# Altium footprint library Rez-Axial Pot.PcbLib: 113 footprints (part 1 of 8)
Each footprint in its own frame and in the unit in brackets; x right, y up, seen from the top. Pads: shape width x height; smd on the part's side, far side on the other; paste and mask are expansions set on the pad; w line width, h text height; cw(c..) or ccw(c..) is an arc to the next point about the centre after c.
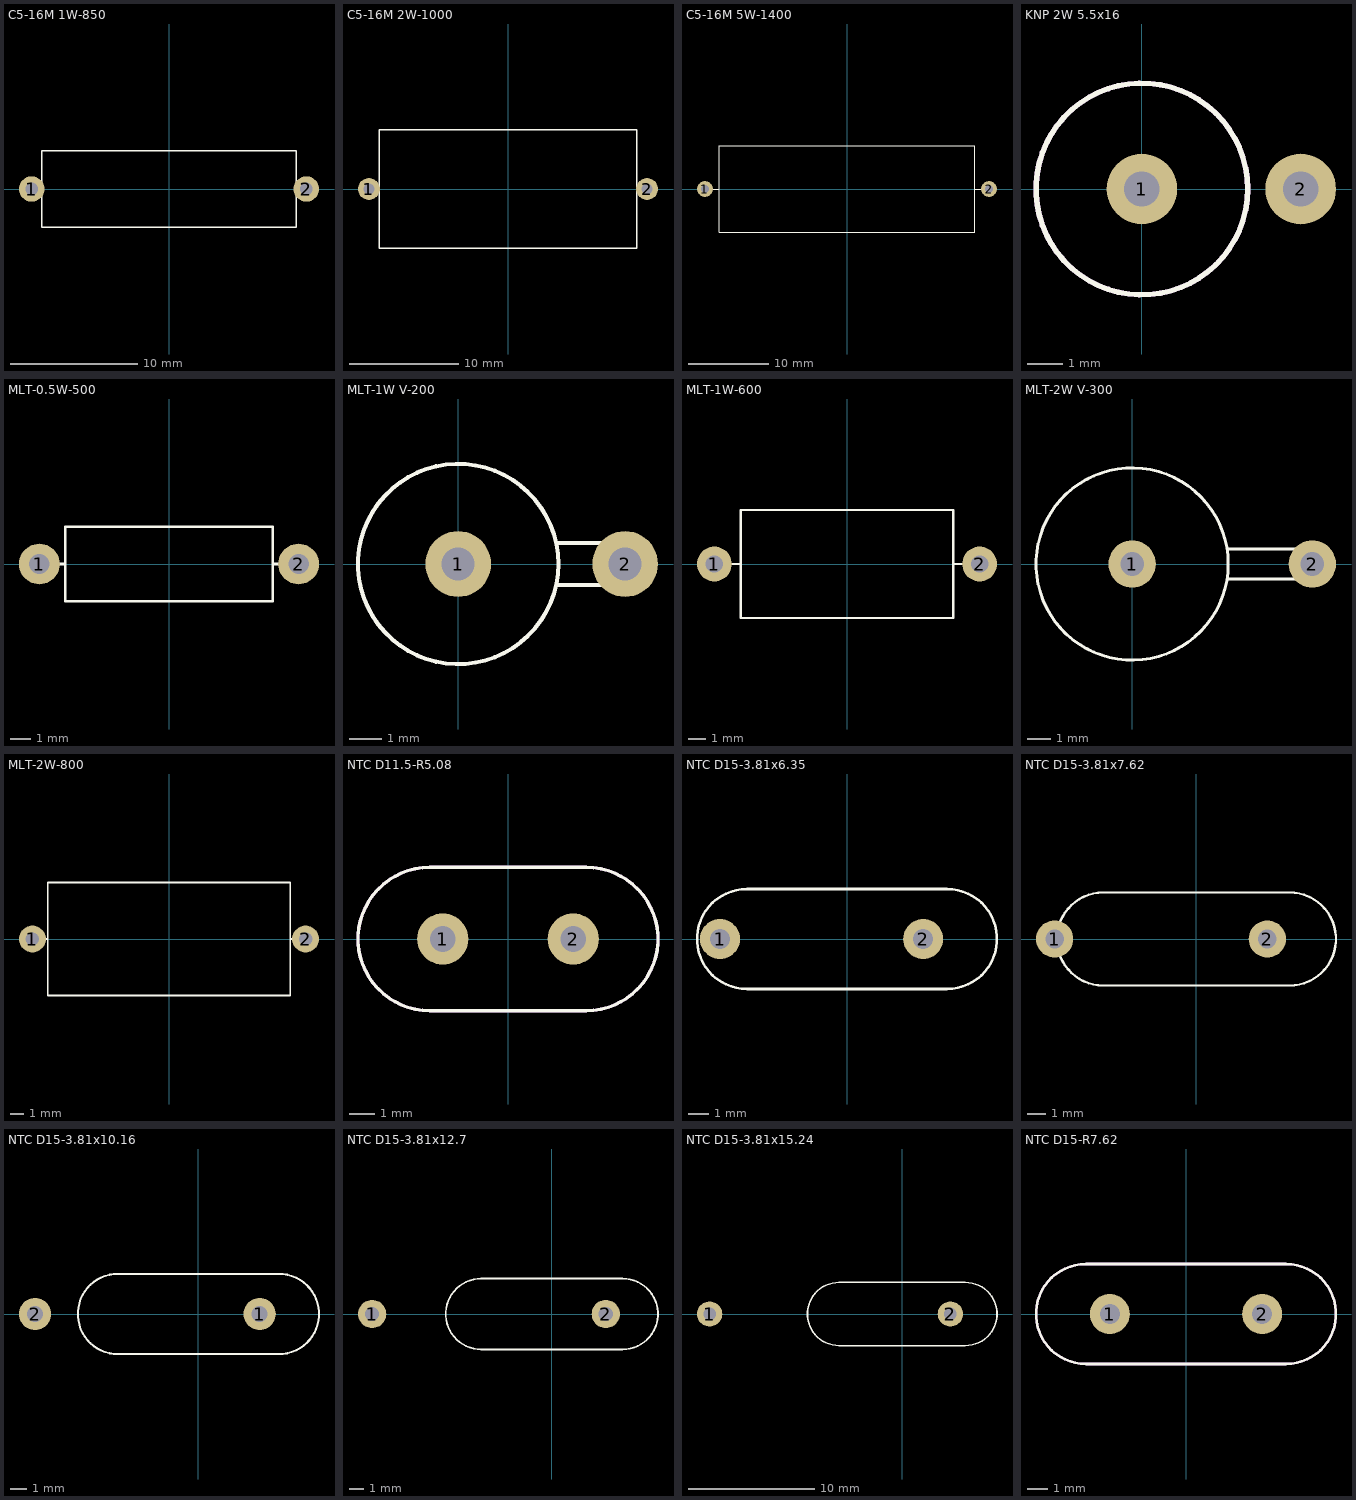
[diagram p0: the footprints below, top view; thin cyan lines are the x and y axes]

## C5-16M 1W-850 [mm]
pads (2):
  round 2 hole 1: 1(-10.795,0) 2(10.795,0)
TopOverlay:
  lines w0.127: -10.795,0 -10,0 ; 10,0 10.795,0 ; -10,-3 -10,3 10,3 10,-3 -10,-3
3D body "C5-16M 1W-850.STEP": height 6, standoff -2.5, extent -11.295,-3 11.295,3

## C5-16M 2W-1000 [mm]
pads (2):
  round 2 hole 1: 1(-12.7,0) 2(12.7,0)
TopOverlay:
  lines w0.127: -12.7,0 -11.75,0 ; 11.75,0 12.7,0 ; -11.75,-5.4 11.75,-5.4 11.75,5.4 -11.75,5.4 -11.75,-5.4
3D body "C5-16M 2W-1000.STEP": height 10.8, standoff -2.5, extent -13.2,-5.4 13.2,5.4

## C5-16M 5W-1400 [mm]
pads (2):
  round 2 hole 1: 1(-17.78,0) 2(17.78,0)
TopOverlay:
  lines w0.127: -17.78,0 -16,0 ; 16,0 17.78,0 ; -16,-5.4 -16,5.4 16,5.4 16,-5.4 -16,-5.4
3D body "C5-16M 5W-1400.STEP": height 10.8, standoff -2.5, extent -18.28,-5.4 18.28,5.4

## KNP 2W 5.5x16 [mm]
pads (2):
  round 2 hole 1 unplated: 1(0,0) 2(4.5,0)
TopOverlay:
  circle w0.15: c0,0 r3
Mechanical3:
  text ".Designator / .Comment" at 1.841,2.238 h1.02
Mechanical13:
  circle w0.15: c0,0 r3
3D body "Res-(3W)MO-150 Ver.STEP": height 18.31, standoff -2.03, extent -2.302,-2.302 4.21,2.302

## MLT-0.5W-500 [mm]
pads (2):
  round 2 hole 1: 1(-6.35,0) 2(6.35,0)
TopOverlay:
  lines w0.127: -5.461,0 -5.08,0 ; 5.105,0 5.461,0 ; -5.08,-1.82 5.08,-1.82 5.08,1.82 -5.08,1.82 -5.08,-1.82
3D body "Res-(0.5W)-MLT 500.STEP": height 3.82, standoff -1.82, extent -6.65,-1.82 6.65,1.82

## MLT-1W V-200 [mm]
pads (2):
  round 2 hole 1: 1(0,0) 2(5.08,0)
TopOverlay:
  circle w0.127: c0,0 r3.048
  lines w0.127: 3.048,-0.635 5.08,-0.635 5.08,0.635 3.048,0.635
3D body "Res-(1W)-MLT V200.STEP": height 15.64, standoff -2.54, extent -3.1,-3.1 5.38,3.1

## MLT-1W-600 [mm]
pads (2):
  round 2 hole 1: 1(-7.62,0) 2(7.62,0)
TopOverlay:
  lines w0.127: -7.62,0 -6.1,0 ; 6.1,0 7.62,0 ; -6.1,-3.1 -6.1,3.1 6.1,3.1 6.1,-3.1 -6.1,-3.1
3D body "Res-(1W)-MLT 600.STEP": height 6.6, standoff -1.6, extent -7.92,-3.1 7.92,3.1

## MLT-2W V-300 [mm]
pads (2):
  round 2 hole 1: 1(0,0) 2(7.62,0)
TopOverlay:
  circle w0.127: c0,0 r4.064
  lines w0.127: 4.064,-0.635 7.62,-0.635 7.62,0.635 4.064,0.635
3D body "Res-(2W)-MLT V300.STEP": height 22.61, standoff -2.54, extent -4.2,-4.2 7.92,4.2

## MLT-2W-800 [mm]
pads (2):
  round 2 hole 1: 1(-10.16,0) 2(10.16,0)
TopOverlay:
  lines w0.127: -9.398,0 -9.017,0 ; 9.017,0 9.373,0 ; -9.017,-4.2 9.017,-4.2 9.017,4.2 -9.017,4.2 -9.017,-4.2
3D body "Res-(2W)-MLT 800.STEP": height 8.7, standoff -1.7, extent -10.46,-4.2 10.46,4.2

## NTC D11.5-R5.08 [mm]
pads (2):
  round 2 hole 1: 1(-2.54,0) 2(2.54,0)
TopOverlay:
  lines w0.127: 3.023,-2.794 -3.048,-2.794 cw(c-3.048,0) -3.048,2.794 3.048,2.794 cw(c3.048,0) 3.048,-2.794
Mechanical13:
  lines w0.127: 3.023,-2.794 -3.048,-2.794 cw(c-3.048,0) -3.048,2.794 3.048,2.794 cw(c3.048,0) 3.048,-2.794
3D body "NTC-B57236.STEP": height 15.75, standoff -3.62, extent -5.75,-2.8 5.75,2.8

## NTC D15-3.81x6.35 [mm]
pads (2):
  round 2 hole 1: 1(-6.35,0) 2(3.81,0)
TopOverlay:
  lines w0.127: -5,-2.5 cw(c-5,0) -5,2.5 5,2.5 cw(c5,0) 5,-2.5 -5,-2.5
3D body "NTC-B57237d-3.81x6.35.STEP": height 22.5, standoff -2.5, extent -7.5,-2.5 7.5,2.5

## NTC D15-3.81x7.62 [mm]
pads (2):
  round 2 hole 1: 1(-7.62,0) 2(3.81,0)
TopOverlay:
  lines w0.127: -5,-2.5 cw(c-5,0) -5,2.5 5,2.5 cw(c5,0) 5,-2.5 -5,-2.5
3D body "NTC-B57237d-3.81x7.62.STEP": height 22.5, standoff -2.5, extent -8.02,-2.5 7.5,2.5

## NTC D15-3.81x10.16 [mm]
pads (2):
  round 2 hole 1: 1(3.81,0) 2(-10.16,0)
TopOverlay:
  lines w0.127: -5,-2.5 cw(c-5,0) -5,2.5 5,2.5 cw(c5,0) 5,-2.5 -5,-2.5
3D body "NTC-B57237d-3.81x10.16.STEP": height 22.5, standoff -2.5, extent -10.56,-2.5 7.5,2.5

## NTC D15-3.81x12.7 [mm]
pads (2):
  round 2 hole 1: 1(-12.7,0) 2(3.81,0)
TopOverlay:
  lines w0.127: -5,-2.5 cw(c-5,0) -5,2.5 5,2.5 cw(c5,0) 5,-2.5 -5,-2.5
3D body "NTC-B57237d-3.81x12.7.STEP": height 22.5, standoff -2.5, extent -13.1,-2.5 7.5,2.5

## NTC D15-3.81x15.24 [mm]
pads (2):
  round 2 hole 1: 1(-15.24,0) 2(3.81,0)
TopOverlay:
  lines w0.127: -5,-2.5 cw(c-5,0) -5,2.5 5,2.5 cw(c5,0) 5,-2.5 -5,-2.5
3D body "NTC-B57237d-3.81x15.24.STEP": height 22.5, standoff -2.5, extent -15.64,-2.5 7.5,2.5

## NTC D15-R7.62 [mm]
pads (2):
  round 2 hole 1: 1(-3.81,0) 2(3.81,0)
TopOverlay:
  lines w0.127: -5,-2.5 cw(c-5,0) -5,2.5 5,2.5 cw(c5,0) 5,-2.5 -5,-2.5
Mechanical13:
  lines w0.127: -5,-2.5 cw(c-5,0) -5,2.5 5,2.5 cw(c5,0) 5,-2.5 -5,-2.5
3D body "NTC-B57237-7.62mm.STEP": height 22.5, standoff -2.5, extent -7.5,-2.5 7.5,2.5